# Altium footprint library 2.54插件排针.PcbLib: 91 footprints (part 2 of 6)
Each footprint in its own frame and in the unit in brackets; x right, y up, seen from the top. Pads: shape width x height; smd on the part's side, far side on the other; paste and mask are expansions set on the pad; w line width, h text height; cw(c..) or ccw(c..) is an arc to the next point about the centre after c.
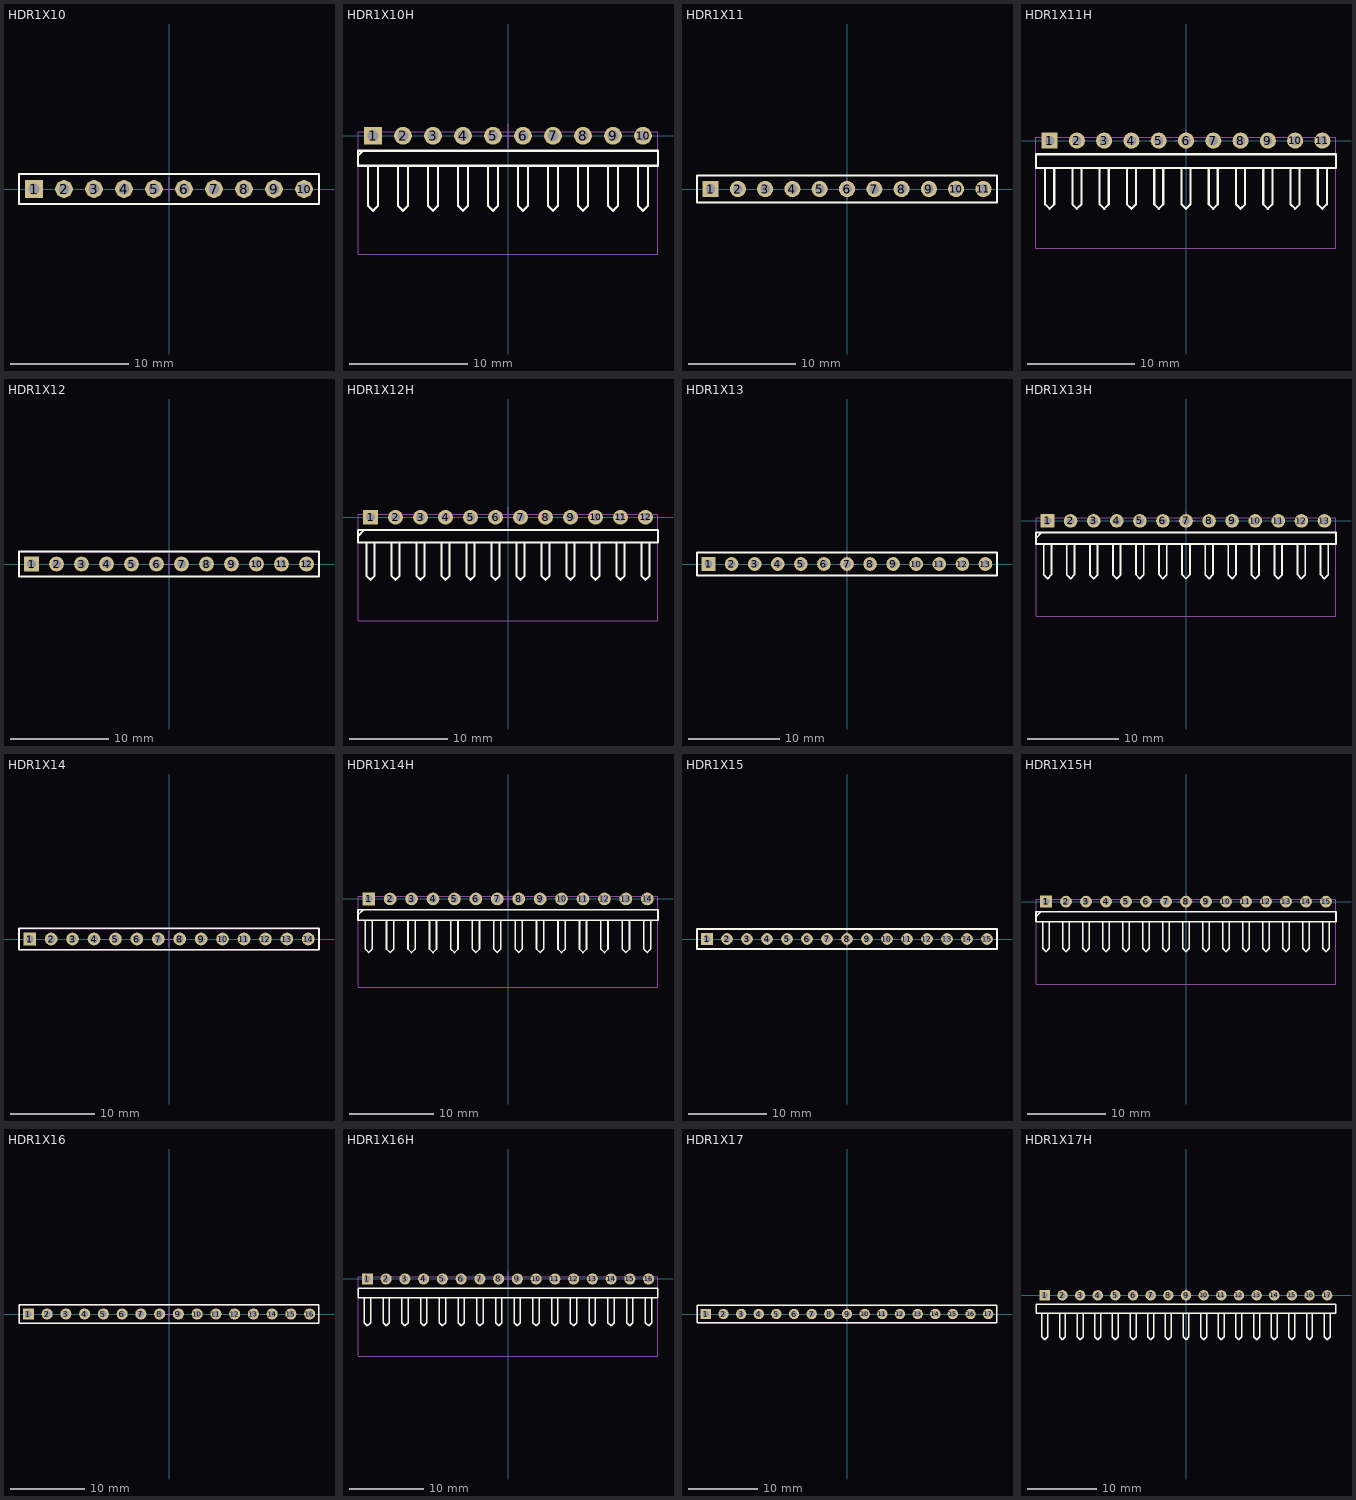
[diagram p1: the footprints below, top view; thin cyan lines are the x and y axes]

## HDR1X10 [mm] "Connector; Header; 10 Position"
pads (10):
  rect 1.5x1.5 hole 0.9: 1(-11.43,0)
  round 1.5 hole 0.9: 2(-8.89,0) 3(-6.35,0) 4(-3.81,0) 5(-1.27,0) 6(1.27,0) 7(3.81,0) 8(6.35,0) 9(8.89,0) 10(11.43,0)
Top Overlay:
  lines w0.2: -12.7,-1.27 12.7,-1.27 12.7,1.27 -10.795,1.27 -12.7,1.27 -12.7,-1.27
Mechanical 13:
  lines w0.05: -12.7,-1.23 12.7,-1.23 12.7,1.27 -12.7,1.27 -12.7,-1.23
Mechanical 15:
  lines w0.1: -1,0 1,0 ; 0,-1 0,1
3D body "sip254p-10v.stp": height 9.05, standoff -2.95, extent -12.7,-1.23 12.7,1.27

## HDR1X10H [mm] "Connector; Header; 10 Position; Right Angle"
pads (10):
  rect 1.5x1.5 hole 0.9: 1(-11.43,0)
  round 1.5 hole 0.9: 2(-8.89,0) 3(-6.35,0) 4(-3.81,0) 5(-1.27,0) 6(1.27,0) 7(3.81,0) 8(6.35,0) 9(8.89,0) 10(11.43,0)
Top Overlay:
  lines w0.2: -12.7,-1.693 -12.277,-1.27 ; -11.853,-2.54 -11.853,-5.927 -11.43,-6.35 -11.007,-5.927 -11.007,-2.54 ; -9.313,-2.54 -9.313,-5.927 -8.89,-6.35 -8.467,-5.927 -8.467,-2.54 ; -6.773,-2.54 -6.773,-5.927 -6.35,-6.35 -5.927,-5.927 -5.927,-2.54 ; -4.233,-2.54 -4.233,-5.927 -3.81,-6.35 -3.387,-5.927 -3.387,-2.54 ; -1.693,-2.54 -1.693,-5.927 -1.27,-6.35 -0.847,-5.927 -0.847,-2.54 ; 0.847,-2.54 0.847,-5.927 1.27,-6.35 1.693,-5.927 1.693,-2.54 ; 3.387,-2.54 3.387,-5.927 3.81,-6.35 4.233,-5.927 4.233,-2.54 ; 5.927,-2.54 5.927,-5.927 6.35,-6.35 6.773,-5.927 6.773,-2.54 ; 8.467,-2.54 8.467,-5.927 8.89,-6.35 9.313,-5.927 9.313,-2.54 ; 11.007,-2.54 11.007,-5.927 11.43,-6.35 11.853,-5.927 11.853,-2.54 ; -12.7,-2.54 -12.7,-1.27 -10.795,-1.27 12.7,-1.27 12.7,-2.54 -12.7,-2.54
Mechanical 13:
  lines w0.05: -12.7,-10.01 -12.7,0.33 12.7,0.33 12.7,-10.01 -12.7,-10.01
Mechanical 15:
  lines w0.1: -1,0 1,0 ; 0,-1 0,1
3D body "sip254p-10h.stp": height 2.51, standoff -2.99, extent -12.7,-10.01 12.7,0.33

## HDR1X11 [mm] "Connector; Header; 11 Position"
pads (11):
  rect 1.5x1.5 hole 0.9: 1(-12.7,0)
  round 1.5 hole 0.9: 2(-10.16,0) 3(-7.62,0) 4(-5.08,0) 5(-2.54,0) 6(0,0) 7(2.54,0) 8(5.08,0) 9(7.62,0) 10(10.16,0) 11(12.7,0)
Top Overlay:
  lines w0.2: -13.97,-1.27 -13.97,1.27 -12.065,1.27 13.97,1.27 13.97,-1.27 -13.97,-1.27
Mechanical 13:
  lines w0.05: -13.97,-1.23 13.97,-1.23 13.97,1.27 -13.97,1.27 -13.97,-1.23
Mechanical 15:
  lines w0.1: -1,0 1,0 ; 0,-1 0,1
3D body "sip254p-11v.stp": height 9.05, standoff -2.95, extent -13.97,-1.23 13.97,1.27

## HDR1X11H [mm] "Connector; Header; 11 Position; Right Angle"
pads (11):
  rect 1.5x1.5 hole 0.9: 1(-12.7,0)
  round 1.5 hole 0.9: 2(-10.16,0) 3(-7.62,0) 4(-5.08,0) 5(-2.54,0) 6(0,0) 7(2.54,0) 8(5.08,0) 9(7.62,0) 10(10.16,0) 11(12.7,0)
Top Overlay:
  lines w0.2: -13.123,-2.54 -13.123,-5.927 -12.7,-6.35 -12.277,-5.927 -12.277,-2.54 ; -10.583,-2.54 -10.583,-5.927 -10.16,-6.35 -9.737,-5.927 -9.737,-2.54 ; -8.043,-2.54 -8.043,-5.927 -7.62,-6.35 -7.197,-5.927 -7.197,-2.54 ; -5.503,-2.54 -5.503,-5.927 -5.08,-6.35 -4.657,-5.927 -4.657,-2.54 ; -2.963,-2.54 -2.963,-5.927 -2.54,-6.35 -2.117,-5.927 -2.117,-2.54 ; -0.423,-2.54 -0.423,-5.927 0,-6.35 0.423,-5.927 0.423,-2.54 ; 2.117,-2.54 2.117,-5.927 2.54,-6.35 2.963,-5.927 2.963,-2.54 ; 4.657,-2.54 4.657,-5.927 5.08,-6.35 5.503,-5.927 5.503,-2.54 ; 7.197,-2.54 7.197,-5.927 7.62,-6.35 8.043,-5.927 8.043,-2.54 ; 9.737,-2.54 9.737,-5.927 10.16,-6.35 10.583,-5.927 10.583,-2.54 ; 12.277,-2.54 12.277,-5.927 12.7,-6.35 13.123,-5.927 13.123,-2.54 ; -13.97,-2.54 13.97,-2.54 13.97,-1.27 -13.97,-1.27 -13.97,-2.54
Mechanical 13:
  lines w0.05: -13.97,-10.01 13.97,-10.01 13.97,0.33 -13.97,0.33 -13.97,-10.01
Mechanical 15:
  lines w0.1: -1,0 1,0 ; 0,-1 0,1
3D body "sip254p-11h.stp": height 2.51, standoff -2.99, extent -13.97,-10.01 13.97,0.33

## HDR1X12 [mm] "Connector; Header; 12 Position"
pads (12):
  rect 1.5x1.5 hole 0.9: 1(-13.97,0)
  round 1.5 hole 0.9: 2(-11.43,0) 3(-8.89,0) 4(-6.35,0) 5(-3.81,0) 6(-1.27,0) 7(1.27,0) 8(3.81,0) 9(6.35,0) 10(8.89,0) 11(11.43,0) 12(13.97,0)
Top Overlay:
  lines w0.2: -15.24,-1.27 -15.24,1.27 -13.335,1.27 15.24,1.27 15.24,-1.27 -15.24,-1.27
Mechanical 13:
  lines w0.05: -15.24,-1.23 15.24,-1.23 ; -15.24,-1.23 -15.24,1.27 ; -15.24,-1.23 15.24,-1.23 ; -15.24,1.27 15.24,1.27 ; -15.24,1.27 15.24,1.27 ; 15.24,-1.23 15.24,1.27 ; 15.24,-1.23 15.24,1.27
Mechanical 15:
  lines w0.1: -1,0 1,0 ; 0,-1 0,1
3D body "sip254p-12v.stp": height 9.05, standoff -2.95, extent -15.24,-1.23 15.24,1.27

## HDR1X12H [mm] "Connector; Header; 12 Position; Right Angle"
pads (12):
  rect 1.5x1.5 hole 0.9: 1(-13.97,0)
  round 1.5 hole 0.9: 2(-11.43,0) 3(-8.89,0) 4(-6.35,0) 5(-3.81,0) 6(-1.27,0) 7(1.27,0) 8(3.81,0) 9(6.35,0) 10(8.89,0) 11(11.43,0) 12(13.97,0)
Top Overlay:
  lines w0.2: -15.24,-1.905 -14.605,-1.27 ; -14.393,-2.54 -14.393,-5.927 -13.97,-6.35 -13.547,-5.927 -13.547,-2.54 ; -11.853,-2.54 -11.853,-5.927 -11.43,-6.35 -11.007,-5.927 -11.007,-2.54 ; -9.313,-2.54 -9.313,-5.927 -8.89,-6.35 -8.467,-5.927 -8.467,-2.54 ; -6.773,-2.54 -6.773,-5.927 -6.35,-6.35 -5.927,-5.927 -5.927,-2.54 ; -4.233,-2.54 -4.233,-5.927 -3.81,-6.35 -3.387,-5.927 -3.387,-2.54 ; -1.693,-2.54 -1.693,-5.927 -1.27,-6.35 -0.847,-5.927 -0.847,-2.54 ; 0.847,-2.54 0.847,-5.927 1.27,-6.35 1.693,-5.927 1.693,-2.54 ; 3.387,-2.54 3.387,-5.927 3.81,-6.35 4.233,-5.927 4.233,-2.54 ; 5.927,-2.54 5.927,-5.927 6.35,-6.35 6.773,-5.927 6.773,-2.54 ; 8.467,-2.54 8.467,-5.927 8.89,-6.35 9.313,-5.927 9.313,-2.54 ; 11.007,-2.54 11.007,-5.927 11.43,-6.35 11.853,-5.927 11.853,-2.54 ; 13.547,-2.54 13.547,-5.927 13.97,-6.35 14.393,-5.927 14.393,-2.54 ; -15.24,-2.54 15.24,-2.54 15.24,-1.27 -13.335,-1.27 -15.24,-1.27 -15.24,-2.54
Mechanical 13:
  lines w0.05: -15.24,-10.49 15.24,-10.49 15.24,0.33 -15.24,0.33 -15.24,-10.49
Mechanical 15:
  lines w0.1: -1,0 1,0 ; 0,-1 0,1
3D body "sip254p-12h.stp": height 2.51, standoff -2.99, extent -15.24,-10.49 15.24,0.33

## HDR1X13 [mm] "Connector; Header; 13 Position"
pads (13):
  rect 1.5x1.5 hole 0.9: 1(-15.24,0)
  round 1.5 hole 0.9: 2(-12.7,0) 3(-10.16,0) 4(-7.62,0) 5(-5.08,0) 6(-2.54,0) 7(0,0) 8(2.54,0) 9(5.08,0) 10(7.62,0) 11(10.16,0) 12(12.7,0) 13(15.24,0)
Top Overlay:
  lines w0.2: -16.51,-1.27 -16.51,1.27 -14.605,1.27 16.51,1.27 16.51,-1.27 -16.51,-1.27
Mechanical 13:
  lines w0.05: -16.51,-1.23 -16.51,1.27 16.51,1.27 16.51,-1.23 -16.51,-1.23
Mechanical 15:
  lines w0.1: -1,0 1,0 ; 0,-1 0,1
3D body "sip254p-13v.stp": height 9.05, standoff -2.95, extent -16.51,-1.23 16.51,1.27

## HDR1X13H [mm] "Connector; Header; 13 Position; Right Angle"
pads (13):
  rect 1.5x1.5 hole 0.9: 1(-15.24,0)
  round 1.5 hole 0.9: 2(-12.7,0) 3(-10.16,0) 4(-7.62,0) 5(-5.08,0) 6(-2.54,0) 7(0,0) 8(2.54,0) 9(5.08,0) 10(7.62,0) 11(10.16,0) 12(12.7,0) 13(15.24,0)
Top Overlay:
  lines w0.2: -16.51,-1.905 -15.875,-1.27 ; -15.663,-2.54 -15.663,-5.927 -15.24,-6.35 -14.817,-5.927 -14.817,-2.54 ; -13.123,-2.54 -13.123,-5.927 -12.7,-6.35 -12.277,-5.927 -12.277,-2.54 ; -10.583,-2.54 -10.583,-5.927 -10.16,-6.35 -9.737,-5.927 -9.737,-2.54 ; -8.043,-2.54 -8.043,-5.927 -7.62,-6.35 -7.197,-5.927 -7.197,-2.54 ; -5.503,-2.54 -5.503,-5.927 -5.08,-6.35 -4.657,-5.927 -4.657,-2.54 ; -2.963,-2.54 -2.963,-5.927 -2.54,-6.35 -2.117,-5.927 -2.117,-2.54 ; -0.423,-2.54 -0.423,-5.927 0,-6.35 0.423,-5.927 0.423,-2.54 ; 2.117,-2.54 2.117,-5.927 2.54,-6.35 2.963,-5.927 2.963,-2.54 ; 4.657,-2.54 4.657,-5.927 5.08,-6.35 5.503,-5.927 5.503,-2.54 ; 7.197,-2.54 7.197,-5.927 7.62,-6.35 8.043,-5.927 8.043,-2.54 ; 9.737,-2.54 9.737,-5.927 10.16,-6.35 10.583,-5.927 10.583,-2.54 ; 12.277,-2.54 12.277,-5.927 12.7,-6.35 13.123,-5.927 13.123,-2.54 ; 14.817,-2.54 14.817,-5.927 15.24,-6.35 15.663,-5.927 15.663,-2.54 ; -16.51,-2.54 16.51,-2.54 16.51,-1.27 -14.605,-1.27 -16.51,-1.27 -16.51,-2.54
Mechanical 13:
  lines w0.05: -16.51,-10.49 16.51,-10.49 16.51,0.33 -16.51,0.33 -16.51,-10.49
Mechanical 15:
  lines w0.1: -1,0 1,0 ; 0,-1 0,1
3D body "sip254p-13h.stp": height 2.51, standoff -2.99, extent -16.51,-10.49 16.51,0.33

## HDR1X14 [mm] "Connector; Header; 14 Position"
pads (14):
  rect 1.5x1.5 hole 0.9: 1(-16.51,0)
  round 1.5 hole 0.9: 2(-13.97,0) 3(-11.43,0) 4(-8.89,0) 5(-6.35,0) 6(-3.81,0) 7(-1.27,0) 8(1.27,0) 9(3.81,0) 10(6.35,0) 11(8.89,0) 12(11.43,0) 13(13.97,0) 14(16.51,0)
Top Overlay:
  lines w0.2: -17.78,-1.27 -17.78,1.27 -15.875,1.27 17.78,1.27 17.78,-1.27 -17.78,-1.27
Mechanical 13:
  lines w0.05: -17.78,-1.27 -17.78,1.23 17.78,1.23 17.78,-1.27 -17.78,-1.27
Mechanical 15:
  lines w0.1: -1,0 1,0 ; 0,-1 0,1
3D body "sip254p-14v.stp": height 9.05, standoff -2.95, extent -17.78,-1.27 17.78,1.23

## HDR1X14H [mm] "Connector; Header; 14 Position; Right Angle"
pads (14):
  rect 1.5x1.5 hole 0.9: 1(-16.51,0)
  round 1.5 hole 0.9: 2(-13.97,0) 3(-11.43,0) 4(-8.89,0) 5(-6.35,0) 6(-3.81,0) 7(-1.27,0) 8(1.27,0) 9(3.81,0) 10(6.35,0) 11(8.89,0) 12(11.43,0) 13(13.97,0) 14(16.51,0)
Top Overlay:
  lines w0.2: -17.78,-1.905 -17.145,-1.27 ; -16.933,-2.54 -16.933,-5.927 -16.51,-6.35 -16.087,-5.927 -16.087,-2.54 ; -14.393,-2.54 -14.393,-5.927 -13.97,-6.35 -13.547,-5.927 -13.547,-2.54 ; -11.853,-2.54 -11.853,-5.927 -11.43,-6.35 -11.007,-5.927 -11.007,-2.54 ; -9.313,-2.54 -9.313,-5.927 -8.89,-6.35 -8.467,-5.927 -8.467,-2.54 ; -6.773,-2.54 -6.773,-5.927 -6.35,-6.35 -5.927,-5.927 -5.927,-2.54 ; -4.233,-2.54 -4.233,-5.927 -3.81,-6.35 -3.387,-5.927 -3.387,-2.54 ; -1.693,-2.54 -1.693,-5.927 -1.27,-6.35 -0.847,-5.927 -0.847,-2.54 ; 0.847,-2.54 0.847,-5.927 1.27,-6.35 1.693,-5.927 1.693,-2.54 ; 3.387,-2.54 3.387,-5.927 3.81,-6.35 4.233,-5.927 4.233,-2.54 ; 5.927,-2.54 5.927,-5.927 6.35,-6.35 6.773,-5.927 6.773,-2.54 ; 8.467,-2.54 8.467,-5.927 8.89,-6.35 9.313,-5.927 9.313,-2.54 ; 11.007,-2.54 11.007,-5.927 11.43,-6.35 11.853,-5.927 11.853,-2.54 ; 13.547,-2.54 13.547,-5.927 13.97,-6.35 14.393,-5.927 14.393,-2.54 ; 16.087,-2.54 16.087,-5.927 16.51,-6.35 16.933,-5.927 16.933,-2.54 ; -17.78,-2.54 17.78,-2.54 17.78,-1.27 -15.875,-1.27 -17.78,-1.27 -17.78,-2.54
Mechanical 13:
  lines w0.05: -17.78,-10.49 17.78,-10.49 17.78,0.33 -17.78,0.33 -17.78,-10.49
Mechanical 15:
  lines w0.1: -1,0 1,0 ; 0,-1 0,1
3D body "sip254p-14h.stp": height 2.51, standoff -2.99, extent -17.78,-10.49 17.78,0.33

## HDR1X15 [mm] "Connector; Header; 15 Position"
pads (15):
  rect 1.5x1.5 hole 0.9: 1(-17.78,0)
  round 1.5 hole 0.9: 2(-15.24,0) 3(-12.7,0) 4(-10.16,0) 5(-7.62,0) 6(-5.08,0) 7(-2.54,0) 8(0,0) 9(2.54,0) 10(5.08,0) 11(7.62,0) 12(10.16,0) 13(12.7,0) 14(15.24,0) 15(17.78,0)
Top Overlay:
  lines w0.2: -19.05,-1.27 -19.05,1.27 -17.145,1.27 19.05,1.27 19.05,-1.27 -19.05,-1.27
Mechanical 13:
  lines w0.05: -19.05,-1.23 19.05,-1.23 19.05,1.27 -19.05,1.27 -19.05,-1.23
Mechanical 15:
  lines w0.1: -1,0 1,0 ; 0,-1 0,1
3D body "sip254p-15v.stp": height 9.05, standoff -2.95, extent -19.05,-1.23 19.05,1.27

## HDR1X15H [mm] "Connector; Header; 15 Position; Right Angle"
pads (15):
  rect 1.5x1.5 hole 0.9: 1(-17.78,0)
  round 1.5 hole 0.9: 2(-15.24,0) 3(-12.7,0) 4(-10.16,0) 5(-7.62,0) 6(-5.08,0) 7(-2.54,0) 8(0,0) 9(2.54,0) 10(5.08,0) 11(7.62,0) 12(10.16,0) 13(12.7,0) 14(15.24,0) 15(17.78,0)
Top Overlay:
  lines w0.2: -19.05,-1.905 -18.415,-1.27 ; -18.203,-2.54 -18.203,-5.927 -17.78,-6.35 -17.357,-5.927 -17.357,-2.54 ; -15.663,-2.54 -15.663,-5.927 -15.24,-6.35 -14.817,-5.927 -14.817,-2.54 ; -13.123,-2.54 -13.123,-5.927 -12.7,-6.35 -12.277,-5.927 -12.277,-2.54 ; -10.583,-2.54 -10.583,-5.927 -10.16,-6.35 -9.737,-5.927 -9.737,-2.54 ; -8.043,-2.54 -8.043,-5.927 -7.62,-6.35 -7.197,-5.927 -7.197,-2.54 ; -5.503,-2.54 -5.503,-5.927 -5.08,-6.35 -4.657,-5.927 -4.657,-2.54 ; -2.963,-2.54 -2.963,-5.927 -2.54,-6.35 -2.117,-5.927 -2.117,-2.54 ; -0.423,-2.54 -0.423,-5.927 0,-6.35 0.423,-5.927 0.423,-2.54 ; 2.117,-2.54 2.117,-5.927 2.54,-6.35 2.963,-5.927 2.963,-2.54 ; 4.657,-2.54 4.657,-5.927 5.08,-6.35 5.503,-5.927 5.503,-2.54 ; 7.197,-2.54 7.197,-5.927 7.62,-6.35 8.043,-5.927 8.043,-2.54 ; 9.737,-2.54 9.737,-5.927 10.16,-6.35 10.583,-5.927 10.583,-2.54 ; 12.277,-2.54 12.277,-5.927 12.7,-6.35 13.123,-5.927 13.123,-2.54 ; 14.817,-2.54 14.817,-5.927 15.24,-6.35 15.663,-5.927 15.663,-2.54 ; 17.357,-2.54 17.357,-5.927 17.78,-6.35 18.203,-5.927 18.203,-2.54 ; -19.05,-2.54 19.05,-2.54 19.05,-1.27 -17.145,-1.27 -19.05,-1.27 -19.05,-2.54
Mechanical 13:
  lines w0.05: -19.05,-10.49 19.05,-10.49 19.05,0.33 -19.05,0.33 -19.05,-10.49
Mechanical 15:
  lines w0.1: -1,0 1,0 ; 0,-1 0,1
3D body "sip254p-15h.stp": height 2.51, standoff -2.99, extent -19.05,-10.49 19.05,0.33

## HDR1X16 [mm] "Connector; Header; 16 Position"
pads (16):
  rect 1.5x1.5 hole 0.9: 1(-19.05,0)
  round 1.5 hole 0.9: 2(-16.51,0) 3(-13.97,0) 4(-11.43,0) 5(-8.89,0) 6(-6.35,0) 7(-3.81,0) 8(-1.27,0) 9(1.27,0) 10(3.81,0) 11(6.35,0) 12(8.89,0) 13(11.43,0) 14(13.97,0) 15(16.51,0) 16(19.05,0)
Top Overlay:
  lines w0.2: -20.32,-1.27 20.32,-1.27 20.32,1.27 -18.415,1.27 -20.32,1.27 -20.32,-1.27
Mechanical 13:
  lines w0.05: -20.32,-1.23 -20.32,1.27 20.32,1.27 20.32,-1.23 -20.32,-1.23
  lines w0.1: -20.32,-1.23 20.32,-1.23 20.32,1.27 -20.32,1.27 -20.32,-1.23
Mechanical 15:
  lines w0.1: -1,0 1,0 ; 0,-1 0,1
3D body "sip254p-16v.stp": height 9.05, standoff -2.95, extent -20.32,-1.23 20.32,1.27

## HDR1X16H [mm] "Connector; Header; 16 Position; Right Angle"
pads (16):
  rect 1.5x1.5 hole 0.9: 1(-19.05,0)
  round 1.5 hole 0.9: 2(-16.51,0) 3(-13.97,0) 4(-11.43,0) 5(-8.89,0) 6(-6.35,0) 7(-3.81,0) 8(-1.27,0) 9(1.27,0) 10(3.81,0) 11(6.35,0) 12(8.89,0) 13(11.43,0) 14(13.97,0) 15(16.51,0) 16(19.05,0)
Top Overlay:
  lines w0.2: -19.473,-2.54 -19.473,-5.927 -19.05,-6.35 -18.627,-5.927 -18.627,-2.54 ; -16.933,-2.54 -16.933,-5.927 -16.51,-6.35 -16.087,-5.927 -16.087,-2.54 ; -14.393,-2.54 -14.393,-5.927 -13.97,-6.35 -13.547,-5.927 -13.547,-2.54 ; -11.853,-2.54 -11.853,-5.927 -11.43,-6.35 -11.007,-5.927 -11.007,-2.54 ; -9.313,-2.54 -9.313,-5.927 -8.89,-6.35 -8.467,-5.927 -8.467,-2.54 ; -6.773,-2.54 -6.773,-5.927 -6.35,-6.35 -5.927,-5.927 -5.927,-2.54 ; -4.233,-2.54 -4.233,-5.927 -3.81,-6.35 -3.387,-5.927 -3.387,-2.54 ; -1.693,-2.54 -1.693,-5.927 -1.27,-6.35 -0.847,-5.927 -0.847,-2.54 ; 0.847,-2.54 0.847,-5.927 1.27,-6.35 1.693,-5.927 1.693,-2.54 ; 3.387,-2.54 3.387,-5.927 3.81,-6.35 4.233,-5.927 4.233,-2.54 ; 5.927,-2.54 5.927,-5.927 6.35,-6.35 6.773,-5.927 6.773,-2.54 ; 8.467,-2.54 8.467,-5.927 8.89,-6.35 9.313,-5.927 9.313,-2.54 ; 11.007,-2.54 11.007,-5.927 11.43,-6.35 11.853,-5.927 11.853,-2.54 ; 13.547,-2.54 13.547,-5.927 13.97,-6.35 14.393,-5.927 14.393,-2.54 ; 16.087,-2.54 16.087,-5.927 16.51,-6.35 16.933,-5.927 16.933,-2.54 ; 18.627,-2.54 18.627,-5.927 19.05,-6.35 19.473,-5.927 19.473,-2.54 ; -20.32,-2.54 20.32,-2.54 20.32,-1.27 -18.415,-1.27 -20.32,-1.27 -20.32,-2.54
Mechanical 13:
  lines w0.1: -20.32,-10.49 -20.32,0.33 20.32,0.33 20.32,-10.49 -20.32,-10.49
Mechanical 15:
  lines w0.1: -1,0 1,0 ; 0,-1 0,1
3D body "sip254p-16h.stp": height 2.51, standoff -2.99, extent -20.32,-10.49 20.32,0.33

## HDR1X17 [mm] "Connector; Header; 17 Position"
pads (17):
  rect 1.5x1.5 hole 0.9: 1(-20.32,0)
  round 1.5 hole 0.9: 2(-17.78,0) 3(-15.24,0) 4(-12.7,0) 5(-10.16,0) 6(-7.62,0) 7(-5.08,0) 8(-2.54,0) 9(0,0) 10(2.54,0) 11(5.08,0) 12(7.62,0) 13(10.16,0) 14(12.7,0) 15(15.24,0) 16(17.78,0) 17(20.32,0)
Top Overlay:
  lines w0.2: -21.59,-1.27 21.59,-1.27 21.59,1.27 -19.685,1.27 -21.59,1.27 -21.59,-1.27
Mechanical 13:
  lines w0.05: -21.59,-1.27 -21.59,1.23 21.59,1.23 21.59,-1.27 -21.59,-1.27
Mechanical 15:
  lines w0.1: -1,0 1,0 ; 0,-1 0,1
3D body "sip254p-17v.stp": height 9.05, standoff -2.95, extent -21.59,-1.27 21.59,1.23

## HDR1X17H [mm] "Connector; Header; 17 Position; Right Angle"
pads (17):
  rect 1.5x1.5 hole 0.9: 1(-20.32,0)
  round 1.5 hole 0.9: 2(-17.78,0) 3(-15.24,0) 4(-12.7,0) 5(-10.16,0) 6(-7.62,0) 7(-5.08,0) 8(-2.54,0) 9(0,0) 10(2.54,0) 11(5.08,0) 12(7.62,0) 13(10.16,0) 14(12.7,0) 15(15.24,0) 16(17.78,0) 17(20.32,0)
Top Overlay:
  lines w0.2: -20.743,-2.54 -20.743,-5.927 -20.32,-6.35 -19.897,-5.927 -19.897,-2.54 ; -18.203,-2.54 -18.203,-5.927 -17.78,-6.35 -17.357,-5.927 -17.357,-2.54 ; -15.663,-2.54 -15.663,-5.927 -15.24,-6.35 -14.817,-5.927 -14.817,-2.54 ; -13.123,-2.54 -13.123,-5.927 -12.7,-6.35 -12.277,-5.927 -12.277,-2.54 ; -10.583,-2.54 -10.583,-5.927 -10.16,-6.35 -9.737,-5.927 -9.737,-2.54 ; -8.043,-2.54 -8.043,-5.927 -7.62,-6.35 -7.197,-5.927 -7.197,-2.54 ; -5.503,-2.54 -5.503,-5.927 -5.08,-6.35 -4.657,-5.927 -4.657,-2.54 ; -2.963,-2.54 -2.963,-5.927 -2.54,-6.35 -2.117,-5.927 -2.117,-2.54 ; -0.423,-2.54 -0.423,-5.927 0,-6.35 0.423,-5.927 0.423,-2.54 ; 2.117,-2.54 2.117,-5.927 2.54,-6.35 2.963,-5.927 2.963,-2.54 ; 4.657,-2.54 4.657,-5.927 5.08,-6.35 5.503,-5.927 5.503,-2.54 ; 7.197,-2.54 7.197,-5.927 7.62,-6.35 8.043,-5.927 8.043,-2.54 ; 9.737,-2.54 9.737,-5.927 10.16,-6.35 10.583,-5.927 10.583,-2.54 ; 12.277,-2.54 12.277,-5.927 12.7,-6.35 13.123,-5.927 13.123,-2.54 ; 14.817,-2.54 14.817,-5.927 15.24,-6.35 15.663,-5.927 15.663,-2.54 ; 17.357,-2.54 17.357,-5.927 17.78,-6.35 18.203,-5.927 18.203,-2.54 ; 19.897,-2.54 19.897,-5.927 20.32,-6.35 20.743,-5.927 20.743,-2.54 ; -21.59,-2.54 21.59,-2.54 21.59,-1.27 -19.685,-1.27 -21.59,-1.27 -21.59,-2.54
Mechanical 15:
  lines w0.1: -1,0 1,0 ; 0,-1 0,1
3D body "sip254p-17h.stp": height 2.51, standoff -2.99, extent -21.59,-10.49 21.59,0.33